# Altium footprint library sun_library.PcbLib: 412 footprints (part 8 of 26)
Each footprint in its own frame and in the unit in brackets; x right, y up, seen from the top. Pads: shape width x height; smd on the part's side, far side on the other; paste and mask are expansions set on the pad; w line width, h text height; cw(c..) or ccw(c..) is an arc to the next point about the centre after c.
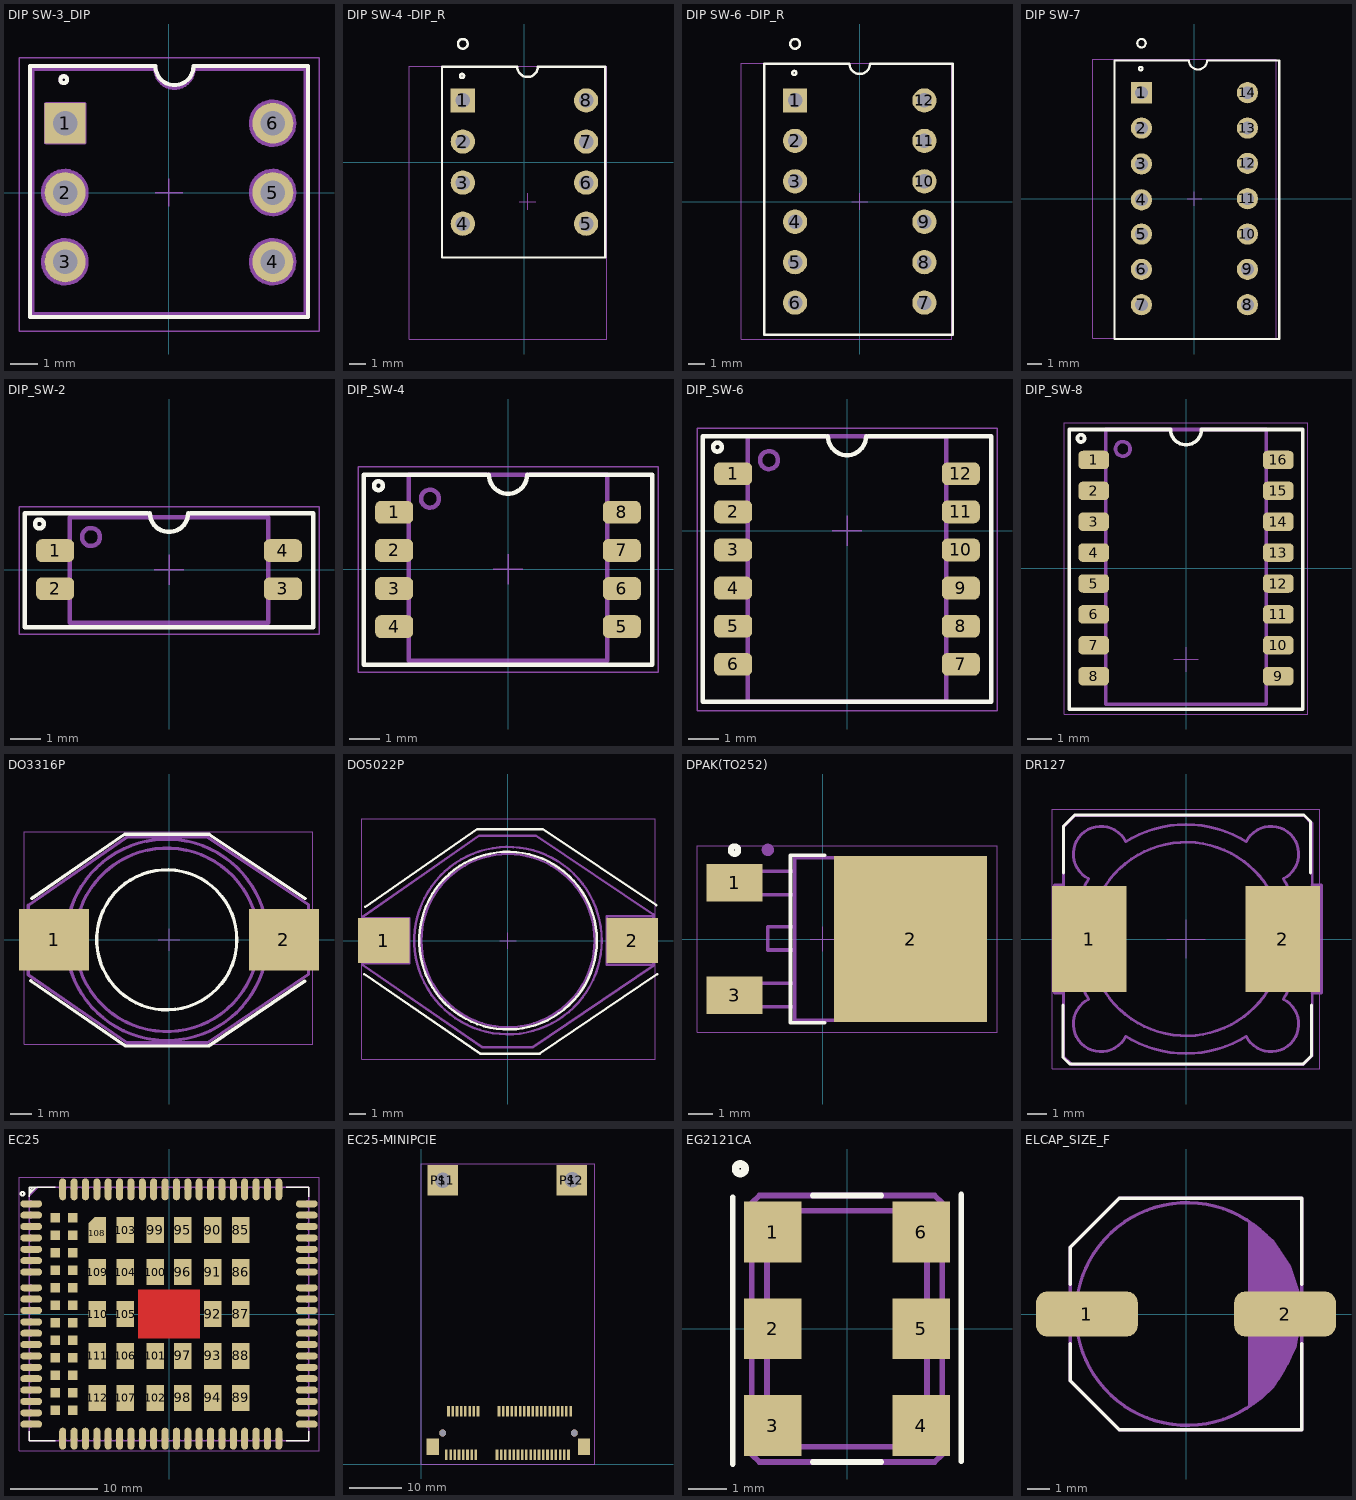
[diagram p7: the footprints below, top view; thin cyan lines are the x and y axes]

## DIP SW-3_DIP [mm] "DS1040-03; 6 Leads; Row Spacing 7.62 mm; Pitch 2.54 mm"
height 5
pads (6):
  rect 1.5x1.5 hole 0.9: 1(-3.81,2.54)
  round 1.5 hole 0.9: 2(-3.81,0) 3(-3.81,-2.54) 4(3.81,-2.54) 5(3.81,0) 6(3.81,2.54)
Top Overlay:
  circle w0.15: c-3.86,4.14 r0.125
  lines w0.15: -5.1,-4.56 5.09,-4.56 5.09,4.64 0.9,4.64 cw(c0.2,4.64) -0.5,4.64 -5.1,4.64 -5.1,-4.56
TopAssy 13:
  circle w0.15: c3.8,2.54 r0.8
  circle w0.15: c-3.86,4.14 r0.125
  circle w0.15: c-3.82,0 r0.8
  circle w0.15: c3.8,0 r0.8
  circle w0.15: c3.8,-2.54 r0.8
  circle w0.15: c-3.82,-2.54 r0.8
  lines w0.15: -5,-4.46 -5,4.54 -0.5,4.54 ccw(c0.2,4.54) 0.9,4.54 5,4.54 5,-4.46 -5,-4.46 ; -4.5,1.84 -3.1,1.84 -3.1,3.24 -4.5,3.24 -4.5,1.84
CourtTop 15:
  lines w0.05: -0.5,0 0.5,0 ; 0,-0.5 0,0.5 ; -5.5,-5.08 -5.5,4.94 5.5,4.94 5.5,-5.08 -5.5,-5.08
3D body "User Library-DS1040-03 (DIP_switch).step": height 6.81, standoff -3.84, extent -4.95,-4.54 4.95,4.54

## DIP SW-4 -DIP_R [mm] "DIP; 8 Leads; Row Spacing 7.62 mm; Pitch 2.54 mm"
height 5
pads (8):
  rect 1.5x1.5 hole 0.9: 1(-3.81,3.81)
  round 1.5 hole 0.9: 2(-3.81,1.27) 3(-3.81,-1.27) 4(-3.81,-3.81) 5(3.81,-3.81) 6(3.81,-1.27) 7(3.81,1.27) 8(3.81,3.81)
Top Overlay:
  circle w0.15: c-3.86,5.325 r0.125
  circle w0.15: c-3.81,7.31 r0.3
  lines w0.15: -5.1,-5.9 -5.1,5.9 -0.445,5.9 ccw(c0.19,5.9) 0.825,5.9 5,5.9 5,-5.9 -5.1,-5.9
CourtTop 15:
  lines w0.05: -0.31,-2.44 0.69,-2.44 ; 0.19,-2.94 0.19,-1.94 ; -7.135,-10.94 -7.135,5.925 5.1,5.925 5.1,-10.94 -7.135,-10.94
3D body "User Library-DS1040-04RT.step": height 9.21, standoff -3.84, extent -6.45,-5.81 4.95,5.81

## DIP SW-6 -DIP_R [mm] "DIP; 12 Leads; Row Spacing 8 mm; Pitch 2.54 mm"
height 5
pads (12):
  rect 1.5x1.5 hole 0.9: 1(-4,6.25)
  round 1.5 hole 0.9: 2(-4,3.75) 3(-4,1.25) 4(-4,-1.25) 5(-4,-3.75) 6(-4,-6.25) 7(4,-6.25) 8(4,-3.75) 9(4,-1.25) 10(4,1.25) 11(4,3.75) 12(4,6.25)
Top Overlay:
  circle w0.15: c-4.05,7.95 r0.125
  circle w0.15: c-4,9.75 r0.3
  lines w0.15: -5.9,-8.25 -5.9,8.525 -0.635,8.525 ccw(c0,8.525) 0.635,8.525 5.75,8.525 5.75,-8.25 -5.9,-8.25
CourtTop 15:
  lines w0.05: -0.5,0 0.5,0 ; 0,-0.5 0,0.5 ; -7.325,-8.5 -7.325,8.55 5.675,8.55 5.675,-8.5 -7.325,-8.5
3D body "19645.stp": height 10.2, standoff -3.2, extent -7.2,-8.375 5.4,8.425

## DIP SW-7 [mm] "DIP; 14 Leads; Row Spacing 7.62 mm; Pitch 2.54 mm"
height 5
pads (14):
  rect 1.5x1.5 hole 0.9: 1(-3.75,7.5)
  round 1.5 hole 0.9: 2(-3.75,5) 3(-3.75,2.46) 4(-3.75,-0.08) 5(-3.75,-2.5) 6(-3.75,-5) 7(-3.75,-7.5) 8(3.75,-7.5) 9(3.75,-5) 10(3.75,-2.5) 11(3.75,0) 12(3.75,2.5) 13(3.75,5) 14(3.75,7.5)
Top Overlay:
  circle w0.15: c-3.8,9.2 r0.125
  circle w0.15: c-3.75,11 r0.3
  lines w0.15: -5.65,-9.925 -5.65,9.775 -0.385,9.775 ccw(c0.25,9.775) 0.885,9.775 6,9.775 6,-9.925 -5.65,-9.925
CourtTop 15:
  lines w0.05: -0.5,0 0.5,0 ; 0,-0.5 0,0.5 ; -7.2,-9.875 -7.2,9.85 5.8,9.85 5.8,-9.875 -7.2,-9.875
3D body "19647.stp": height 10.2, standoff -3.2, extent -7.15,-9.67 5.45,9.67

## DIP_SW-2 [mm] "1571983-3 TE Connectivity"
height 5
pads (4):
  rrect50% 1.27x0.76 smd: 1(-3.795,0.635) 2(-3.795,-0.635) 3(3.795,-0.635) 4(3.795,0.635)
Top Overlay:
  circle w0.15: c-4.318,1.524 r0.149
  lines w0.15: -0.7,1.89 -4.8,1.89 -4.8,-1.92 4.8,-1.92 4.8,1.89 0.7,1.89 ; -0.635,1.89 ccw(c0,1.89) 0.635,1.89
TopAssy 13:
  circle w0.15: c-2.6,1.09 r0.3
  lines w0.15: -3.3,0.49 -4.1,0.49 -4.1,0.79 -3.3,0.79 ; -3.298,-0.78 -4.098,-0.78 -4.098,-0.48 -3.298,-0.48 ; 3.3,-0.79 4.1,-0.79 4.1,-0.49 3.3,-0.49 ; 3.3,0.48 4.1,0.48 4.1,0.78 3.3,0.78 ; -3.3,-1.77 3.3,-1.77 3.3,1.755 -3.3,1.755 -3.3,-1.77
CourtTop 15:
  lines w0.05: -0.5,0 0.5,0 ; 0,-0.5 0,0.5 ; -5,-2.145 5,-2.145 5,2.105 -5,2.105 -5,-2.145
3D body "43609.stp": height 2.1, standoff 0, extent -3.825,-1.81 4.175,1.77

## DIP_SW-4 [mm] "1571983-5 TE Connectivity"
height 5
pads (8):
  rrect50% 1.27x0.76 smd: 1(-3.795,1.905) 2(-3.795,0.635) 3(-3.795,-0.635) 4(-3.795,-1.905) 5(3.795,-1.905) 6(3.795,-0.635) 7(3.795,0.635) 8(3.795,1.905)
Top Overlay:
  circle w0.15: c-4.318,2.794 r0.149
  lines w0.15: -0.7,3.16 -4.8,3.16 -4.8,-3.175 4.8,-3.175 4.8,3.16 0.7,3.16 ; -0.635,3.16 ccw(c0,3.16) 0.635,3.16
TopAssy 13:
  circle w0.15: c-2.6,2.36 r0.3
  lines w0.15: -3.3,-2.05 -4.1,-2.05 -4.1,-1.75 -3.3,-1.75 ; -3.3,-0.78 -4.1,-0.78 -4.1,-0.48 -3.3,-0.48 ; -3.3,1.76 -4.1,1.76 -4.1,2.06 -3.3,2.06 ; -3.298,0.49 -4.098,0.49 -4.098,0.79 -3.298,0.79 ; 3.298,-2.06 4.098,-2.06 4.098,-1.76 3.298,-1.76 ; 3.298,-0.79 4.098,-0.79 4.098,-0.49 3.298,-0.49 ; 3.3,0.48 4.1,0.48 4.1,0.78 3.3,0.78 ; 3.3,1.75 4.1,1.75 4.1,2.05 3.3,2.05 ; -3.3,-3.048 -3.3,3.16 3.3,3.16 3.3,-3.048 -3.3,-3.048
CourtTop 15:
  lines w0.05: -0.5,0 0.5,0 ; 0,-0.5 0,0.5 ; -5,-3.429 -5,3.429 5,3.429 5,-3.429 -5,-3.429
3D body "43610.stp": height 2.1, standoff 0, extent -4,-3.06 4,3.06

## DIP_SW-6 [mm] "1571983-8 TE Connectivity"
height 5
pads (12):
  rrect50% 1.27x0.76 smd: 1(-3.795,1.905) 2(-3.795,0.635) 3(-3.795,-0.635) 4(-3.795,-1.905) 5(-3.795,-3.175) 6(-3.795,-4.445) 7(3.795,-4.445) 8(3.795,-3.175) 9(3.795,-1.905) 10(3.795,-0.635) 11(3.795,0.635) 12(3.795,1.905)
Top Overlay:
  circle w0.15: c-4.318,2.794 r0.149
  lines w0.15: -0.7,3.16 -4.8,3.16 -4.8,-5.7 4.8,-5.7 4.8,3.16 0.7,3.16 ; -0.635,3.16 ccw(c0,3.16) 0.635,3.16
TopAssy 13:
  circle w0.15: c-2.6,2.36 r0.3
  lines w0.15: -3.3,-4.59 -4.1,-4.59 -4.1,-4.29 -3.3,-4.29 ; -3.3,-3.32 -4.1,-3.32 -4.1,-3.02 -3.3,-3.02 ; -3.3,-2.05 -4.1,-2.05 -4.1,-1.75 -3.3,-1.75 ; -3.3,-0.78 -4.1,-0.78 -4.1,-0.48 -3.3,-0.48 ; -3.3,0.49 -4.1,0.49 -4.1,0.79 -3.3,0.79 ; -3.3,1.76 -4.1,1.76 -4.1,2.06 -3.3,2.06 ; 3.3,-4.6 4.1,-4.6 4.1,-4.3 3.3,-4.3 ; 3.3,-3.33 4.1,-3.33 4.1,-3.03 3.3,-3.03 ; 3.3,-2.06 4.1,-2.06 4.1,-1.76 3.3,-1.76 ; 3.3,-0.79 4.1,-0.79 4.1,-0.49 3.3,-0.49 ; 3.3,0.48 4.1,0.48 4.1,0.78 3.3,0.78 ; 3.3,1.75 4.1,1.75 4.1,2.05 3.3,2.05 ; -3.3,-5.7 -3.3,3.16 3.3,3.16 3.3,-5.7 -3.3,-5.7
CourtTop 15:
  lines w0.05: -0.5,0 0.5,0 ; 0,-0.5 0,0.5 ; -5,-6 -5,3.429 5,3.429 5,-6 -5,-6
3D body "User Library-1571983-8_DIP_Switch_Tyco_Electronics.step": height 2.95, standoff 0.6, extent -4.066,-5.65 4.066,3.1

## DIP_SW-8 [mm] "1-1571983-1 TE Connectivity"
height 5
pads (16):
  rrect50% 1.27x0.76 smd: 1(-3.795,4.445) 2(-3.795,3.175) 3(-3.795,1.905) 4(-3.795,0.635) 5(-3.795,-0.635) 6(-3.795,-1.905) 7(-3.795,-3.175) 8(-3.795,-4.445) 9(3.795,-4.445) 10(3.795,-3.175) 11(3.795,-1.905) 12(3.795,-0.635) 13(3.795,0.635) 14(3.795,1.905) 15(3.795,3.175) 16(3.795,4.445)
Top Overlay:
  circle w0.15: c-4.318,5.334 r0.149
  lines w0.15: -0.7,5.7 -4.8,5.7 -4.8,-5.8 4.8,-5.8 4.8,5.7 0.7,5.7 ; -0.635,5.7 ccw(c0,5.7) 0.635,5.7
TopAssy 13:
  circle w0.15: c-2.6,4.9 r0.3
  lines w0.15: -3.3,-4.59 -4.1,-4.59 -4.1,-4.29 -3.3,-4.29 ; -3.3,0.49 -4.1,0.49 -4.1,0.79 -3.3,0.79 ; -3.3,1.76 -4.1,1.76 -4.1,2.06 -3.3,2.06 ; -3.3,4.3 -4.1,4.3 -4.1,4.6 -3.3,4.6 ; -3.298,-3.32 -4.098,-3.32 -4.098,-3.02 -3.298,-3.02 ; -3.298,-2.05 -4.098,-2.05 -4.098,-1.75 -3.298,-1.75 ; -3.298,-0.78 -4.098,-0.78 -4.098,-0.48 -3.298,-0.48 ; -3.298,3.03 -4.098,3.03 -4.098,3.33 -3.298,3.33 ; 3.298,-0.79 4.098,-0.79 4.098,-0.49 3.298,-0.49 ; 3.298,0.48 4.098,0.48 4.098,0.78 3.298,0.78 ; 3.298,1.75 4.098,1.75 4.098,2.05 3.298,2.05 ; 3.3,-4.6 4.1,-4.6 4.1,-4.3 3.3,-4.3 ; 3.3,-3.33 4.1,-3.33 4.1,-3.03 3.3,-3.03 ; 3.3,-2.06 4.1,-2.06 4.1,-1.76 3.3,-1.76 ; 3.3,3.02 4.1,3.02 4.1,3.32 3.3,3.32 ; 3.3,4.29 4.1,4.29 4.1,4.59 3.3,4.59 ; -3.3,-5.6 -3.3,5.7 3.3,5.7 3.3,-5.6 -3.3,-5.6
CourtTop 15:
  lines w0.05: -0.5,-3.755 0.5,-3.755 ; 0,-4.255 0,-3.255 ; -5,-6 -5,5.969 5,5.969 5,-6 -5,-6
3D body "SW3dPS-HRM-08-T.STEP": height 2.4, standoff 0, extent -4.1,-5.65 4.1,5.65

## DO3316P [mm] "Coilcraft SMT Power Inductors – DO3316P Series"
pads (2):
  rect 3.2x2.8 smd: 1(-5.25,0) 2(5.25,0)
Top Overlay:
  circle w0.15: c-0.1,0 r3.2
  lines w0.15: -6.315,-1.87 -1.99,-4.85 1.814,-4.85 6.2,-1.886 ; -6.267,1.886 -2.035,4.825 1.833,4.825 6.217,1.887
TopAssy 13:
  circle w0.15: c-0.1,0 r4.19
  circle w0.15: c-0.1,0 r4.6
  lines w0.15: -6.475,-1.2 -3.975,-1.2 -3.975,1.275 -6.475,1.275 -6.475,-1.2 ; -6.425,-1.6 -1.925,-4.7 1.75,-4.7 6.375,-1.575 6.375,1.6 1.75,4.7 -1.925,4.7 -6.425,1.575 -6.425,-1.6 ; 3.775,-1.25 3.775,1.225 6.325,1.225 6.325,-1.25 3.775,-1.25
CourtTop 15:
  lines w0.05: -0.5,0 0.5,0 ; 0,-0.5 0,0.5 ; -6.6,-4.775 -6.6,4.925 6.575,4.925 6.575,-4.775 -6.6,-4.775
3D body "User Library-DO3316P.step": height 5.21, standoff 0, extent -6.505,-4.675 6.455,4.725

## DO5022P [mm] "Coilcraft SMT Power Inductors – DO5022P Series"
pads (2):
  rect 3.2x2.79 smd: 1(-7.685,0) 2(7.685,0)
Top Overlay:
  circle w0.15: c0,0 r5.5
  lines w0.15: -8.889,-2.072 -1.735,-7 1.956,-7 9.249,-2.072 ; -8.841,2.085 -1.908,6.9 2.16,6.9 9.169,2.202
TopAssy 13:
  circle w0.15: c0,0 r5.801
  circle w0.15: c0,0 r5.366
  lines w0.15: -9,-1.504 -1.602,-6.6 1.528,-6.6 8.99,-1.558 8.99,1.627 1.719,6.5 -1.768,6.5 -9,1.478 -9,-1.504 ; -9,-1.4 -6.1,-1.4 -6.1,1.4 -9,1.4 -9,-1.4 ; 6.1,-1.5 8.99,-1.5 8.99,1.5 6.1,1.5 6.1,-1.5
CourtTop 15:
  lines w0.05: -0.5,0 0.5,0 ; 0,-0.5 0,0.5 ; -9.05,-7.35 9.1,-7.35 9.1,7.55 -9.05,7.55 -9.05,-7.35
3D body "Coilcraft-DO5022P.step": height 7.1, standoff 0, extent -9,-7.3 9.034,7.432

## DPAK(TO252) [mm]
height 2.39
pads (3):
  rect 2.28x1.524 smd: 1(-3.58,2.28) 3(-3.58,-2.28)
  rect 6.23x6.74 smd paste-5: 2(3.58,0)
Top Overlay:
  circle w0.25: c-3.58,3.615 r0.149
  lines w0.15: 0.095,-3.4 -1.3,-3.4 -1.3,3.4 0.095,3.4
Top Paste:
  region: 6.17,-0.4 4.095,-0.4 4.095,-2.925 6.17,-2.925
  region: 2.995,-0.4 0.92,-0.4 0.92,-2.925 2.995,-2.925
  rectangle: 4.095,0.4 6.17,2.925
  rectangle: 0.92,0.375 2.995,2.9
TopAssy 13:
  circle w0.25: c-2.225,3.625 r0.125
  lines w0.15: -1.13,-2.75 -3.655,-2.75 -3.655,-1.8 -1.13,-1.8 ; -1.13,-0.45 -2.23,-0.45 -2.23,0.5 -1.13,0.5 ; -1.13,1.8 -3.655,1.8 -3.655,2.75 -1.13,2.75 ; 4.87,-3.3 -1.13,-3.3 -1.13,3.3 4.87,3.3 ; 4.875,-3.295 4.875,3.295 6.17,2 6.17,-2 4.875,-3.295
CourtTop 15:
  lines w0.05: -0.5,0 0.5,0 ; 0,-0.5 0,0.5 ; -5.105,-3.8 7.095,-3.8 7.095,3.8 -5.105,3.8 -5.105,-3.8
3D body "DPAK_TO-252AA.STEP": height 2.37, standoff -0.03, extent -4.198,-3.367 5.902,3.367

## DR127 [mm] "SMT power inductors, DR127 series"
height 8
pads (2):
  rect 3.85x5.5 smd paste-2: 1(-5,0) 2(5,0)
Top Overlay:
  lines w0.15: -6.35,-3.4 -6.35,-6.125 -6.025,-6.45 6.075,-6.45 6.475,-6.05 6.475,-3.4 ; -6.325,3.4 -6.325,5.825 -5.75,6.4 6.1,6.4 6.425,6.075 6.425,3.4
Top Paste:
  rectangle: 3.175,0.275 6.925,2.7
  region: 6.925,-0.275 3.175,-0.275 3.175,-2.725 6.925,-2.725
  region: -3.175,-0.275 -6.925,-0.275 -6.925,-2.7 -3.175,-2.7
  rectangle: -6.925,0.275 -3.175,2.7
TopAssy 13:
  circle w0.15: c0,0 r5
  lines w0.15: -6.325,-2.8 -6.8,-2.8 -6.8,2.8 -6.325,2.8 ; 6.5,-2.8 7,-2.8 7,2.8 6.5,2.8 ; -6.325,-6.075 -6.325,5.8 -5.75,6.375 6.1,6.375 6.525,5.95 6.525,-6.013 6.063,-6.475 -5.925,-6.475 -6.325,-6.075 ; -5.029,-3.118 ccw(c-4.396,-4.396) -3.118,-5.029 ccw(c0,0) 3.118,-5.029 ccw(c4.396,-4.396) 5.029,-3.118 ccw(c0,0) 5.029,3.118 ccw(c4.396,4.396) 3.118,5.029 ccw(c0,0) -3.118,5.029 ccw(c-4.396,4.396) -5.029,3.118 ccw(c0,0) -5.029,-3.118
CourtTop 15:
  lines w0.05: -1,0 1,0 ; 0,-1 0,1 ; -6.9,-6.7 -6.9,6.7 6.9,6.7 6.9,-6.7 -6.9,-6.7
3D body "User Library-b82477g4.step": height 8, standoff 0, extent -6.325,-6.4 6.475,6.4

## EC25 [mm]
pads (134):
  oval 2.5x0.8 smd: 1(-15.75,12.6) 2(-15.75,11.3) 3(-15.75,10) 4(-15.75,8.7) 5(-15.75,7.4) 6(-15.75,6.1) 7(-15.75,4.8) 8(-15.75,0.4) 9(-15.75,-0.9) 10(-15.75,-2.2) 11(-15.75,-3.5) 12(-15.75,-4.8) 13(-15.75,-6.1) 14(-15.75,-7.4) 15(-15.75,-8.7) 16(-15.75,-10) 17(-15.75,-11.3) 18(-15.75,-12.6) 37(15.75,-12.6) 38(15.75,-11.3) 39(15.75,-10) 40(15.75,-8.7) 41(15.75,-7.4) 42(15.75,-6.1) 43(15.75,-4.8) 44(15.75,-3.5) 45(15.75,-2.2) 46(15.75,-0.9) 47(15.75,0.4) 48(15.75,4.8) 49(15.75,6.1) 50(15.75,7.4) 51(15.75,8.7) 52(15.75,10) 53(15.75,11.3) 54(15.75,12.6) 141(-15.75,3) 142(-15.75,1.7) 143(15.75,1.7) 144(15.75,3)
  oval 0.8x2.5 smd: 19(-9.55,-14.25) 20(-8.25,-14.25) 21(-6.95,-14.25) 22(-5.65,-14.25) 23(-4.35,-14.25) 24(-3.05,-14.25) 25(-1.75,-14.25) 26(-0.45,-14.25) 27(0.85,-14.25) 28(2.15,-14.25) 29(3.45,-14.25) 30(4.75,-14.25) 31(6.05,-14.25) 32(7.35,-14.25) 33(8.65,-14.25) 34(9.95,-14.25) 35(11.25,-14.25) 36(12.55,-14.25) 55(12.55,14.25) 56(11.25,14.25) 57(9.95,14.25) 58(8.65,14.25) 59(7.35,14.25) 60(6.05,14.25) 61(4.75,14.25) 62(3.45,14.25) 63(2.15,14.25) 64(0.85,14.25) 65(-0.45,14.25) 66(-1.75,14.25) 67(-3.05,14.25) 68(-4.35,14.25) 69(-5.65,14.25) 70(-6.95,14.25) 71(-8.25,14.25) 72(-9.55,14.25) 113(-10.85,14.25) 114(-12.15,14.25) 115(-10.85,-14.25) 116(-12.15,-14.25)
  rect 2x3 smd: 85(8.2,9.6) 86(8.2,4.8) 87(8.2,0) 88(8.2,-4.8) 89(8.2,-9.6) 90(5,9.6) 91(5,4.8) 92(5,0) 93(5,-4.8) 94(5,-9.6) 95(1.6,9.6) 96(1.6,4.8) 97(1.6,-4.8) 98(1.6,-9.6) 99(-1.6,9.6) 100(-1.6,4.8) 101(-1.6,-4.8) 102(-1.6,-9.6) 103(-5,9.6) 104(-5,4.8) 105(-5,0) 106(-5,-4.8) 107(-5,-9.6) 109(-8.2,4.8) 110(-8.2,0) 111(-8.2,-4.8) 112(-8.2,-9.6)
  rect 1x1 smd rot 45: 108(-8.502,10.392)
  rect 2x2.3 smd: 108(-8.205,9.248)
  rect 1.3x1 smd: 108(-7.855,10.595)
  rect 1.1x1.1 smd: 117(-11,11) 118(-11,9) 119(-11,7) 120(-11,5) 121(-11,3) 122(-11,1) 123(-11,-1) 124(-11,-3) 125(-11,-5) 126(-11,-7) 127(-11,-9) 128(-11,-11) 129(-13,11) 130(-13,9) 131(-13,7) 132(-13,5) 133(-13,3) 134(-13,1) 135(-13,-1) 136(-13,-3) 137(-13,-5) 138(-13,-7) 139(-13,-9) 140(-13,-11)
Top:
  pour cut-out: 3.5,2.8 -3.5,2.8 -3.5,-2.8 3.5,-2.8
Top Overlay:
  circle w0.25: c-16.75,13.75 r0.206
  lines w0.15: -16,-13.4 -16,-14.5 -13,-14.5 ; -16,13.4 -16,14.5 ; -16,13.75 -15.25,14.5 ; -13,14.5 -16,14.5 ; 13.4,-14.5 16,-14.5 16,-13.4 ; 13.4,14.5 16,14.5 16,13.4 ; -16,14.5 -15.55,14.5 -16,14.05 -16,14.5
TopAssy 13:
  drawing of 165 lines, arcs and shapes, not listed
CourtTop 15:
  circle w0.05: c0,0 r0.5
  lines w0.05: -1,0 1,0 ; 0,-1 0,1 ; -17.15,-15.65 -17.15,15.65 17.15,15.65 17.15,-15.65 -17.15,-15.65
3D body "Quectel EC21-AUTL.step": height 2.55, standoff 0.01, extent -16.005,-14.5 16.025,14.56

## EC25-MINIPCIE [mm]
pads (60):
  round 1.3 hole 1.3: 1(4.1,5.89) 1(29.1,5.89)
  round 3 hole 3: 1(4.1,53.9) 1(28.7,54)
  rect 0.5x2 smd: 1(4.8,1.79) 2(5.2,9.99) 3(5.6,1.79) 4(6,9.99) 5(6.4,1.79) 6(6.8,9.99) 7(7.2,1.79) 8(7.6,9.99) 9(8,1.79) 10(8.4,9.99) 11(8.8,1.79) 12(9.2,9.99) 13(9.6,1.79) 14(10,9.99) 15(10.4,1.79) 16(10.8,9.99) 17(14.4,1.79) 18(14.8,9.99) 19(15.2,1.79) 20(15.6,9.99) 21(16,1.79) 22(16.4,9.99) 23(16.8,1.79) 24(17.2,9.99) 25(17.6,1.79) 26(18,9.99) 27(18.4,1.79) 28(18.8,9.99) 29(19.2,1.79) 30(19.6,9.99) 31(20,1.79) 32(20.4,9.99) 33(20.8,1.79) 34(21.2,9.99) 35(21.6,1.79) 36(22,9.99) 37(22.4,1.79) 38(22.8,9.99) 39(23.2,1.79) 40(23.6,9.99) 41(24,1.79) 42(24.4,9.99) 43(24.8,1.79) 44(25.2,9.99) 45(25.6,1.79) 46(26,9.99) 47(26.4,1.79) 48(26.8,9.99) 49(27.2,1.79) 50(27.6,9.99) 51(28,1.79) 52(28.4,9.99)
  rect 5.8x5.8 smd: P$1(4.1,53.9) P$2(28.6,53.9)
  rect 2.3x3.2 smd: P$27(30.95,3.29) P$28(2.2,3.29)
3DTop 1:
  lines w0.127: 0,0 0,57 33,57 33,0 0,0

## EG2121CA [mm]
pads (6):
  rect 1.5x1.6 smd: 1(-1.95,2.54) 2(-1.95,0) 3(-1.95,-2.54) 4(1.95,-2.54) 5(1.95,0) 6(1.95,2.54)
Top Overlay:
  circle w0.2: c-2.8,4.2 r0.125
  lines w0.15: -3,-3.55 -3,3.45 ; -0.9,-3.5 0.9,-3.5 ; -0.9,3.5 0.9,3.5 ; 3,-3.475 3,3.525
TopAssy 13:
  lines w0.15: -2.5,-3.3 -2.5,3.3 -2.3,3.5 2.3,3.5 2.5,3.3 2.5,-3.3 2.3,-3.5 -2.3,-3.5 -2.5,-3.3 ; -2.1,-3.1 2.1,-3.1 2.1,3.1 -2.1,3.1 -2.1,-3.1
3D body "User Library-EG-2121CA.step": height 1.2, standoff 0, extent -2.502,-3.502 2.503,3.502

## ELCAP_SIZE_F [mm]
height 10.5
pads (2):
  rrect50% 4.57x2.03 smd: 1(-4.45,0) 2(4.45,0)
Top Overlay:
  lines w0.15: -5.2,-1.325 -5.2,-3 -3,-5.2 5.2,-5.2 5.2,-1.325 ; -5.2,1.325 -5.2,3 -3,5.2 5.2,5.2 5.2,1.325
TopAssy 13:
  circle w0.15: c0.055,0 r5
  region: 2.805,4.175 2.805,-4.25 3.429,-3.81 3.937,-3.302 4.445,-2.54 4.953,-1.524 5.08,-0.762 5.08,1.016 4.699,2.159 3.937,3.302 2.855,4.2
  lines w0.15: -5.2,-3 -3,-5.2 5.2,-5.2 5.2,5.2 -3,5.2 -5.2,3 -5.2,-3